# Altium footprint library lib_ic_FOOTPRINTS.PcbLib: 98 footprints (part 4 of 7)
Each footprint in its own frame and in the unit in brackets; x right, y up, seen from the top. Pads: shape width x height; smd on the part's side, far side on the other; paste and mask are expansions set on the pad; w line width, h text height; cw(c..) or ccw(c..) is an arc to the next point about the centre after c.
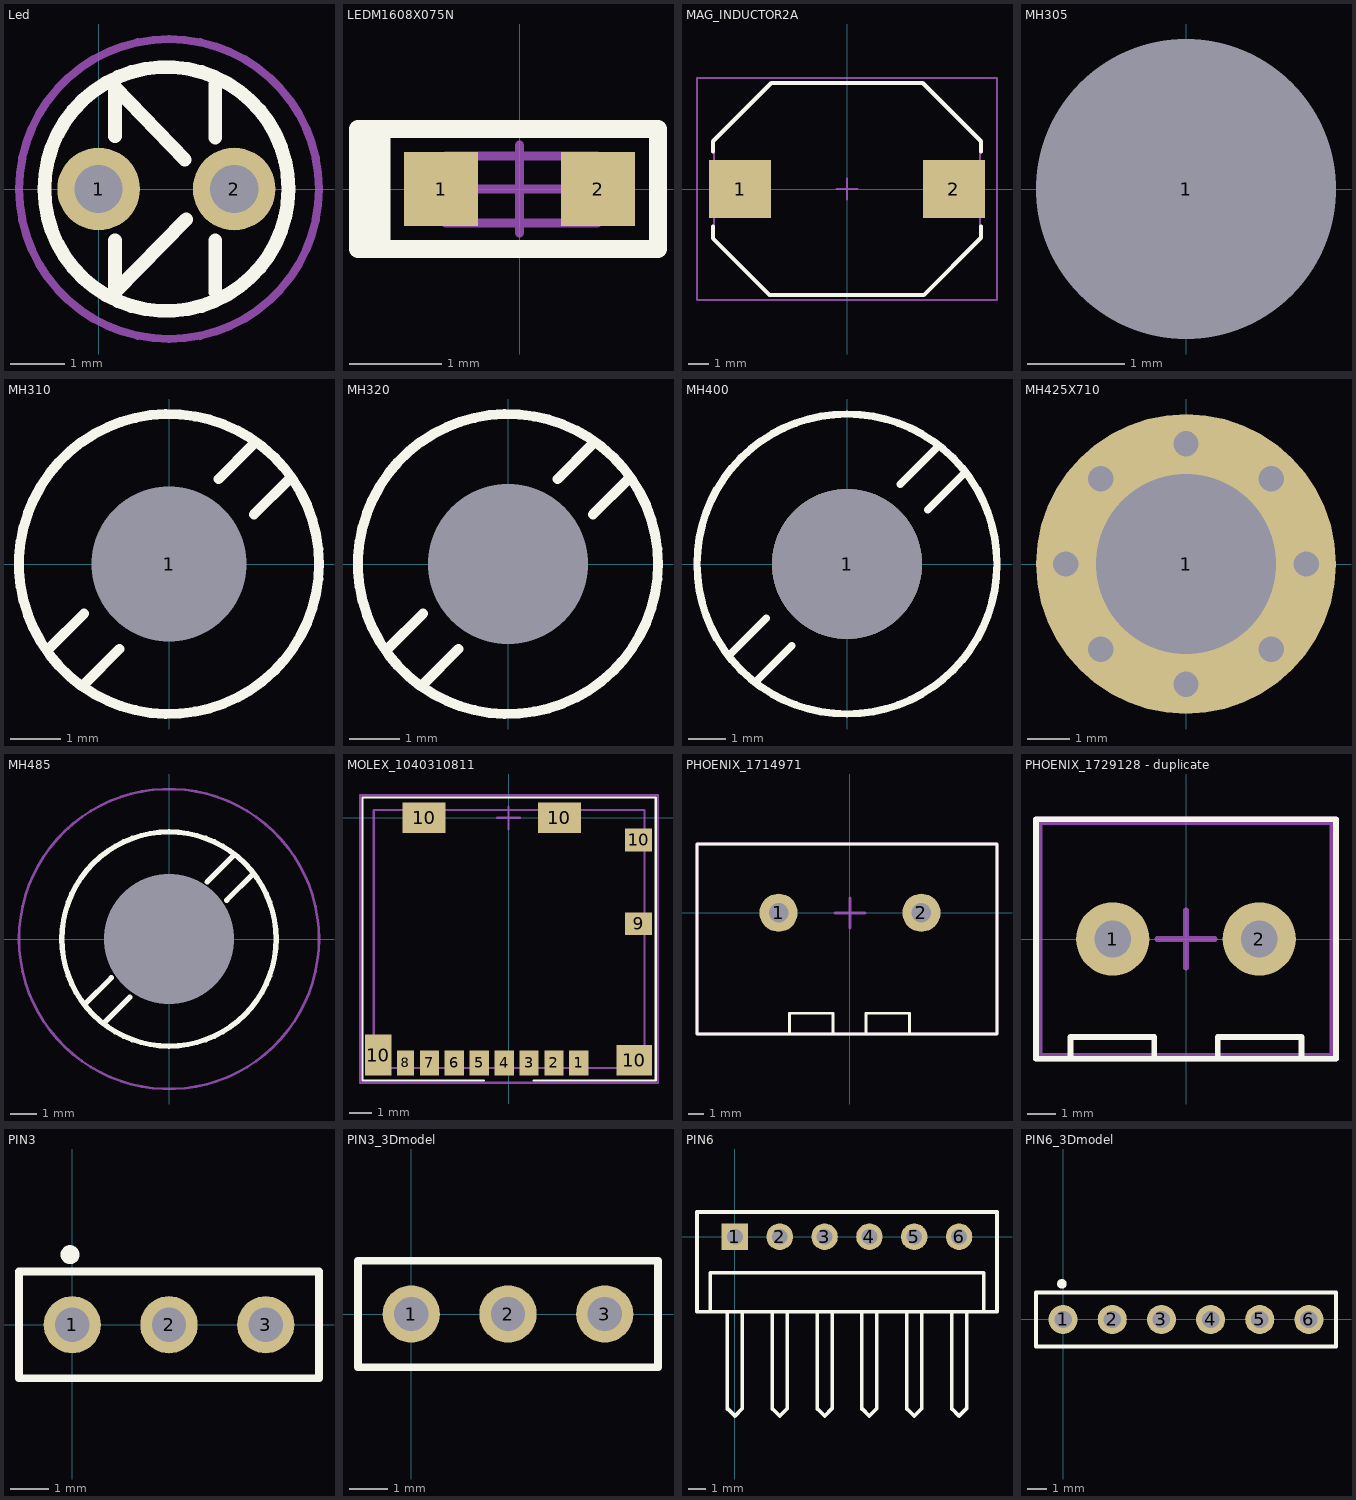
[diagram p3: the footprints below, top view; thin cyan lines are the x and y axes]

## Led [mil]
pads (2):
  round 60 hole 35: 1(0,0) 2(98.43,0)
Top Overlay:
  circle w10: c49.21,0 r88.58
  lines w10: 11.81,-37.4 11.81,-74.8 63.54,-22.19 ; 11.81,38.39 11.81,73.82 62.6,21.28 ; 84.65,-74.8 84.65,-37.4 ; 84.65,37.4 84.65,75.79
Mechanical 15:
  circle w5.91: c51.09,0 r108.91
3D body "SW3dPS-LEDd3G.STEP": height 237.04, standoff -77.93, extent -15.51,-64.9 114.42,64.58

## LEDM1608X075N [mm] "Molded LED, 0603, Body: 1.6mm X 0.8mm"
height 0.75
pads (2):
  rect 0.8x0.8 smd: 1(-0.85,0) 2(0.85,0)
Top Overlay:
  region: -1.75,-0.65 -1.4,-0.65 -1.4,0.65 -1.75,0.65
  lines w0.2: -1.75,-0.65 -1.75,0.65 1.5,0.65 1.5,-0.65 -1.75,-0.65
Mechanical 13:
  lines w0.1: -0.8,-0.368 -0.8,0.357 0.842,0.357 0.842,-0.368 -0.8,-0.368
Mechanical 15:
  lines w0.1: -0.475,0 0.475,0 ; 0,-0.475 0,0.475 ; -1.5,-0.65 -1.5,0.65 1.5,0.65 1.5,-0.65 -1.5,-0.65
3D body "User Library-LED SMD0603.step": height 0.68, standoff 0, extent -0.808,-0.368 0.842,0.357

## MAG_INDUCTOR2A [mm] "Precision Wire Wound Inductor, 2-Leads, Body 12,7x10,0mm, IPC Medium Density"
height 5.2
pads (2):
  rect 3x2.8 smd: 1(-5.15,0) 2(5.15,0)
Top Overlay:
  lines w0.2: -6.45,-1.8 -6.45,-2.375 -3.725,-5.1 3.7,-5.1 6.45,-2.35 6.45,-1.8 ; -6.45,1.8 -6.45,2.3 -3.65,5.1 3.65,5.1 6.45,2.3 6.45,1.8
Mechanical 13:
  lines w0.1: -6.4,-2.425 -6.4,2.35 -3.65,5.1 3.675,5.1 6.4,2.375 6.4,-2.4 3.7,-5.1 -3.725,-5.1 -6.4,-2.425
Mechanical 15:
  lines w0.1: -0.5,0 0.5,0 ; 0,-0.5 0,0.5 ; -7.225,-5.35 -7.225,5.35 7.225,5.35 7.225,-5.35 -7.225,-5.35
3D body "srr1005.stp": height 5.2, standoff 0, extent -6.477,-5 6.223,5

## MH305 [mm] "Mounting Hole, 3.05mm diameter"
pads (1):
  round 3 hole 3.1 unplated: 1(0,0)

## MH310 [mm] "Mounting Hole, 3.1mm diameter"
pads (1):
  round 3 hole 3.1 unplated: 1(0,0)
Top Overlay:
  circle w0.2: c0,0 r3
  lines w0.2: -2.404,-1.697 -1.697,-0.99 ; -1.697,-2.404 -0.99,-1.697 ; 0.99,1.697 1.697,2.404 ; 1.697,0.99 2.404,1.697

## MH320 [mm] "Mounting Hole, 3.2mm diameter"
pads (1):
  round 0 hole 3.2 unplated: 1(0,0)
Top Overlay:
  circle w0.2: c0,0 r3
  lines w0.2: -2.404,-1.697 -1.697,-0.99 ; -1.697,-2.404 -0.99,-1.697 ; 0.99,1.697 1.697,2.404 ; 1.697,0.99 2.404,1.697

## MH400 [mm] "Mounting Hole, 4mm diameter - 8mm Clearance"
pads (1):
  round 4 hole 4 unplated: 1(0,0)
Top Overlay:
  circle w0.2: c0,0 r4
  lines w0.2: -3.154,-2.447 -2.154,-1.446 ; -2.447,-3.154 -1.471,-2.179 ; 1.421,2.129 2.447,3.154 ; 2.154,1.446 3.154,2.447
Mechanical 13:
  circle w0.1: c0,0 r4
Mechanical 15:
  circle w0.1: c0,0 r4

## MH425X710 [mm] "Single THT Connector for Screw (4.25mm Hole X 7.10mm Pad)"
pads (1):
  round 7.1 hole 4.25: 1(0,0)
via -2.85,0 diameter 1 hole 0.6
via -2.015,2.015 diameter 1 hole 0.6
via 0,2.85 diameter 1 hole 0.6
via 2.015,2.015 diameter 1 hole 0.6
via 2.85,0 diameter 1 hole 0.6
via 2.015,-2.015 diameter 1 hole 0.6
via 0,-2.85 diameter 1 hole 0.6
via -2.015,-2.015 diameter 1 hole 0.6

## MH485 [mm] "Mounting Hole, 4.85mm diameter - 3.1mm Clearance - Non Plated"
pads (1):
  round 0 hole 4.85 unplated: 1(0,0)
Top Overlay:
  circle w0.2: c0,0 r4
  lines w0.2: -3.154,-2.447 -2.154,-1.446 ; -2.447,-3.154 -1.471,-2.179 ; 1.421,2.129 2.447,3.154 ; 2.154,1.446 3.154,2.447
Mechanical 13:
  circle w0.1: c0,0 r5.6
Mechanical 15:
  circle w0.1: c0,0 r5.6

## MOLEX_1040310811 [mm] "Micro SD Holder"
height 15
pads (14):
  rect 0.85x1.1 smd mask+0.05: 1(3.105,-10.825) 2(2.005,-10.825) 3(0.905,-10.825) 4(-0.195,-10.825) 5(-1.295,-10.825) 6(-2.395,-10.825) 7(-3.495,-10.825)
  rect 0.75x1.1 smd mask+0.05: 8(-4.55,-10.825)
  rect 1.2x1 smd: 9(5.74,-4.675) 10(5.74,-0.975)
  rect 1.17x1.8 smd mask+0.075: 10(-5.75,-10.475)
  rect 1.9x1.35 smd: 10(-3.73,0) 10(2.24,0)
  rect 1.55x1.35 smd: 10(5.55,-10.7)
Top Overlay:
  lines w0.1: -1.1,-11.6 -6.45,-11.6 -6.45,-1.65 -6.45,0.9 -4.7,0.9 6.5,0.9 6.5,-1.1 6.5,-11.6 1.1,-11.6
Mechanical 13:
  lines w0.1: -5.95,-11.05 6,-11.05 6,-1.4 6,0.35 -5.95,0.35 -5.95,-1.2 -5.95,-11.05
Mechanical 15:
  lines w0.1: -0.5,0 0.5,0 ; 0,-0.5 0,0.5 ; -6.55,-11.7 6.6,-11.7 6.6,1 -6.55,1 -6.55,-11.7
3D body "1040310811.stp": height 1.44, standoff -0.01, extent -5.925,-11.05 6.025,0.35

## PHOENIX_1714971 [mm] "Terminal Block 5.08mm pitch, vertical, 2 positions pcb mounting, Phoenix Contact"
height 10
pads (2):
  round 2.54 hole 1.3: 1(-4.76,0) 2(4.76,0)
Top Overlay:
  lines w0.2: -4.026,-8.05 -4.026,-6.7 -1.126,-6.7 -1.126,-8.05 ; 1.074,-8.05 1.074,-6.7 3.974,-6.7 3.974,-8.05 ; -10.2,-8.1 -10.2,4.6 9.8,4.6 9.8,-8.1 -10.2,-8.1
Mechanical 13:
  lines w0.2: -10.2,-8.1 -10.2,4.6 9.8,4.6 9.8,-8.1 -10.2,-8.1
Mechanical 15:
  lines w0.2: -1,0 1,0 ; 0,-1 0,1 ; -10.2,-8.1 9.8,-8.1 9.8,4.6 -10.2,4.6 -10.2,-8.1
3D body "pxc_1714971_04_MKDS-5-2-9-5_3D.stp": height 21.51, standoff -4.99, extent -10.105,-8 9.505,4.5

## PHOENIX_1729128 - duplicate [mm] "Terminal Block 5.08mm pitch, vertical, 2 positions pcb mounting, Phoenix Contact"
height 10
pads (2):
  round 2.54 hole 1.27: 1(-2.54,0) 2(2.54,0)
Top Overlay:
  lines w0.2: -4,-4.15 -4,-3.4 -1.1,-3.4 -1.1,-4.15 ; 1.1,-4.15 1.1,-3.4 4,-3.4 4,-4.15 ; 5.15,-4.15 -5.2,-4.15 -5.2,4.15 5.15,4.15 ; 5.2,-4.15 5.2,4.15
Mechanical 13:
  lines w0.2: -5.08,-4.05 -5.08,4.05 5.08,4.05 5.08,-4.05 -5.08,-4.05
Mechanical 15:
  lines w0.2: -1,0 1,0 ; 0,-1 0,1 ; 5.15,-4.15 -5.2,-4.15 -5.2,4.15 5.15,4.15 ; 5.2,-4.15 5.2,4.15
3D body "1729128.stp": height 10, standoff -3.5, extent -5.65,-4.05 5.08,4.05

## PIN3 [mm]
pads (3):
  round 1.5 hole 0.9: 1(0,0) 3(5.08,0)
  oval 1.51x1.5 hole 0.9: 2(2.54,0)
Top Overlay:
  circle w0.25: c-0.062,1.841 r0.125
  lines w0.2: -1.4,-1.4 -1.4,1.4 6.48,1.4 6.48,-1.4 -1.4,-1.4

## PIN3_3Dmodel [mm]
pads (3):
  round 1.5 hole 0.9: 1(0,0) 3(5.08,0)
  oval 1.51x1.5 hole 0.9: 2(2.54,0)
Top Overlay:
  lines w0.2: -1.4,-1.4 -1.4,1.4 6.48,1.4 6.48,-1.4 -1.4,-1.4
3D body "User Library-PinHeaderX3.STEP": height 8.51, standoff -3.68, extent -1.206,-1.46 6.413,1.46

## PIN6 [mm]
pads (6):
  rect 1.5x1.5 hole 0.9: 1(0,0)
  oval 1.51x1.5 hole 0.9: 2(2.54,0)
  round 1.5 hole 0.9: 3(5.08,0) 4(7.62,0) 5(10.16,0) 6(12.7,0)
Top Overlay:
  lines w0.2: -1.4,-4.25 -1.4,-2.032 14.1,-2.032 14.1,-4.25 ; -0.423,-9.764 -0.423,-4.318 ; -0.423,-9.737 0,-10.16 0.423,-9.737 0.423,-4.318 ; 2.117,-9.764 2.117,-4.318 ; 2.117,-9.737 2.54,-10.16 2.963,-9.737 2.963,-4.318 ; 4.657,-9.764 4.657,-4.318 ; 4.657,-9.737 5.08,-10.16 5.503,-9.737 5.503,-4.318 ; 7.197,-9.764 7.197,-4.318 ; 7.197,-9.737 7.62,-10.16 8.043,-9.737 8.043,-4.318 ; 9.737,-9.764 9.737,-4.318 ; 9.737,-9.737 10.16,-10.16 10.583,-9.737 10.583,-4.318 ; 12.277,-9.764 12.277,-4.318 ; 12.277,-9.737 12.7,-10.16 13.123,-9.737 13.123,-4.318 ; -2.15,-4.25 14.85,-4.25 14.85,1.4 -2.15,1.4 -2.15,-4.25
3D body "PH1RB-06-UA.STEP": height 2.51, standoff -3.04, extent -1.274,-9.966 13.974,0.254

## PIN6_3Dmodel [mm]
pads (6):
  round 1.5 hole 0.9: 1(0,0) 3(5.08,0) 5(10.16,0)
  oval 1.51x1.5 hole 0.9: 2(2.54,0) 4(7.62,0) 6(12.7,0)
Top Overlay:
  circle w0.25: c-0.062,1.841 r0.125
  lines w0.2: 14.097,-1.4 -1.4,-1.4 -1.4,1.4 14.097,1.4 ; 14.1,-1.4 14.1,1.4
3D body "User Library-PinHeaderX3.STEP": height 8.51, standoff -3.68, extent -1.206,-1.46 6.413,1.46
3D body "User Library-PinHeaderX3.STEP": height 8.51, standoff -3.68, extent 6.413,-1.46 14.034,1.46